# Altium footprint library R 6 DSX 04.PcbLib: 27 footprints (part 2 of 2)
Each footprint in its own frame and in the unit in brackets; x right, y up, seen from the top. Pads: shape width x height; smd on the part's side, far side on the other; paste and mask are expansions set on the pad; w line width, h text height; cw(c..) or ccw(c..) is an arc to the next point about the centre after c.
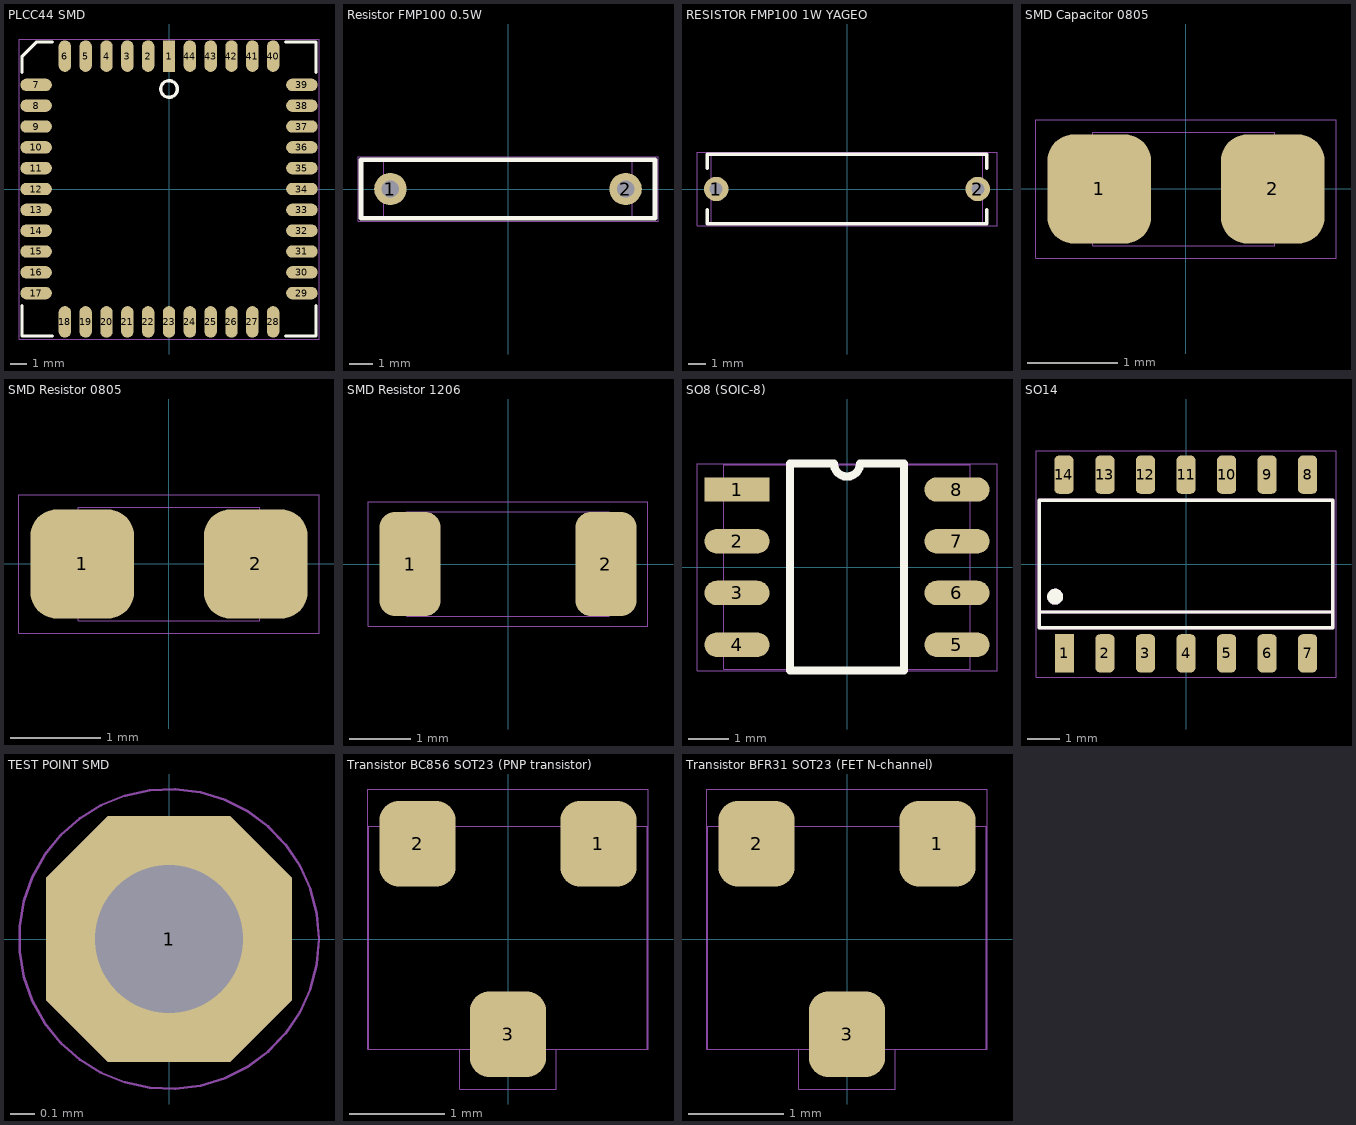
[diagram p1: the footprints below, top view; thin cyan lines are the x and y axes]

## PLCC44 SMD [mm]
height 6.86
pads (44):
  rect 0.76x1.92 smd: 1(0,8.1)
  oval 0.76x1.92 smd: 2(-1.27,8.1) 3(-2.54,8.1) 4(-3.81,8.1) 5(-5.08,8.1) 6(-6.35,8.1) 18(-6.35,-8.1) 19(-5.08,-8.1) 20(-3.81,-8.1) 21(-2.54,-8.1) 22(-1.27,-8.1) 23(0,-8.1) 24(1.27,-8.1) 25(2.54,-8.1) 26(3.81,-8.1) 27(5.08,-8.1) 28(6.35,-8.1) 40(6.35,8.1) 41(5.08,8.1) 42(3.81,8.1) 43(2.54,8.1) 44(1.27,8.1)
  oval 1.92x0.76 smd: 7(-8.1,6.35) 8(-8.1,5.08) 9(-8.1,3.81) 10(-8.1,2.54) 11(-8.1,1.27) 12(-8.1,0) 13(-8.1,-1.27) 14(-8.1,-2.54) 15(-8.1,-3.81) 16(-8.1,-5.08) 17(-8.1,-6.35) 29(8.1,-6.35) 30(8.1,-5.08) 31(8.1,-3.81) 32(8.1,-2.54) 33(8.1,-1.27) 34(8.1,0) 35(8.1,1.27) 36(8.1,2.54) 37(8.1,3.81) 38(8.1,5.08) 39(8.1,6.35)
Top Overlay:
  circle w0.2: c0,6.096 r0.508
  lines w0.2: -8.96,-7.11 -8.96,-8.96 -7.11,-8.96 ; -8.96,7.11 -8.96,8.1 -8.1,8.96 -7.11,8.96 ; 7.11,-8.96 8.96,-8.96 8.96,-7.11 ; 7.11,8.96 8.96,8.96 8.96,7.11
Mechanical 3:
  lines w0.01: -9.144,-9.144 9.144,-9.144 9.144,9.144 -9.144,9.144 -9.144,-9.144
Mechanical 12:
  text ".Designator" at -6.096,-1.524 h4
3D body "MT9092.STEP": height 4.57, standoff 0, extent -8.765,-8.765 8.765,8.765

## Resistor FMP100 0.5W [mm] "Film Resistor FMP100 1W horisontal 10.16 mm by Yageo"
pads (2):
  round 1.4 / inner round 0 / far side round 1.4 hole 0.75: 1(-5.08,0) 2(5.08,0)
Top Overlay:
  lines w0.2: -6.35,-1.27 6.35,-1.27 6.35,1.27 -6.35,1.27 -6.35,-1.27
Mechanical 3:
  lines w0.01: -6.477,-1.397 6.477,-1.397 6.477,1.397 -6.477,1.397 -6.477,-1.397
Mechanical 7:
  lines w0.01: -5.355,-1.2 5.355,-1.2 5.355,1.2 -5.355,1.2 -5.355,-1.2
Mechanical 12:
  text ".Designator" at -1.905,-0.508 h1
3D body "FMP100 1W Hor.STEP": height 4.2, standoff -3, extent -5.355,-1.2 5.355,1.2

## RESISTOR FMP100 1W YAGEO [mm] "Film Resistor FMP100 1W horisontal 10.16 mm by Yageo"
pads (2):
  round 1.4 / inner round 0 / far side round 1.6 hole 0.75: 1(-7.5,0) 2(7.5,0)
Top Overlay:
  lines w0.2: -8,-1.2 -8,-2 8,-2 8,-1.2 ; -8,1.2 -8,2 8,2 8,1.2
Mechanical 3:
  lines w0.01: -8.6,-2.1 -8.6,2.1 8.6,2.1 8.6,-2.1 -8.6,-2.1
Mechanical 7:
  lines w0.01: -7.775,-2 7.775,-2 7.775,2 -7.775,2 -7.775,-2
Mechanical 12:
  text ".Designator" at -1.905,-0.508 h1
3D body "1W SLIM.STEP": height 4.5, standoff -2.5, extent -7.775,-2 7.775,2

## SMD Capacitor 0805 [mm] "Without marking on surface"
height 6.86
pads (2):
  rrect50% 1.14x1.2 smd: 1(-0.955,0) 2(0.955,0)
Mechanical 3:
  lines w0.01: -1.651,-0.762 1.651,-0.762 1.651,0.762 -1.651,0.762 -1.651,-0.762
Mechanical 7:
  lines w0.01: -1.024,-0.625 0.974,-0.625 0.974,0.625 -1.024,0.625 -1.024,-0.625
Mechanical 12:
  text ".Designator" at 0.451,0.435 h4
3D body "0805-2.stp": height 0.8, standoff 0, extent -1.025,-0.625 0.975,0.625

## SMD Resistor 0805 [mm] "Without marking on surface"
height 6.86
pads (2):
  rrect50% 1.14x1.2 smd: 1(-0.955,0) 2(0.955,0)
Mechanical 3:
  lines w0.01: -1.651,-0.762 1.651,-0.762 1.651,0.762 -1.651,0.762 -1.651,-0.762
Mechanical 7:
  lines w0.01: -1,-0.625 1,-0.625 1,0.625 -1,0.625 -1,-0.625
Mechanical 12:
  text ".Designator" at 7.564,1.524 h4
3D body "0805.step": height 0.6, standoff 0, extent -1,-0.625 1,0.625

## SMD Resistor 1206 [mm]
height 6.86
pads (2):
  rrect50% 1x1.7 smd: 1(-1.6,0) 2(1.6,0)
Mechanical 3:
  lines w0.01: -2.286,-1.016 -2.286,1.016 2.286,1.016 2.286,-1.016 -2.286,-1.016
Mechanical 7:
  lines w0.01: -1.65,-0.85 -1.65,0.85 1.65,0.85 1.65,-0.85 -1.65,-0.85
Mechanical 12:
  text ".Designator" at -2.877,-1.84 h4
3D body "RESC-1206.stp": height 0.65, standoff 0, extent -1.65,-0.85 1.65,0.85

## SO8 (SOIC-8) [mm]
height 6.86
pads (8):
  rect 1.6x0.6 smd: 1(-2.7,1.905)
  oval 1.6x0.6 smd: 2(-2.7,0.635) 3(-2.7,-0.635) 4(-2.7,-1.905) 5(2.7,-1.905) 6(2.7,-0.635) 7(2.7,0.635) 8(2.7,1.905)
Top Overlay:
  lines w0.2: -1.397,-2.54 1.397,-2.54 1.397,2.54 0.318,2.54 cw(c0,2.54) -0.318,2.54 -1.397,2.54 -1.397,-2.54
Mechanical 3:
  lines w0.01: -3.683,-2.54 -3.683,2.54 3.683,2.54 3.683,-2.54 -3.683,-2.54
Mechanical 7:
  lines w0.01: -3.021,-2.51 -3.021,2.51 3.021,2.51 3.021,-2.51 -3.021,-2.51
Mechanical 12:
  text ".Designator" at 0.175,-2.429 h4
3D body "sop-8.step": height 1.6, standoff 0, extent -3.021,-2.51 3.021,2.51

## SO14 [mm] "SOIC; 14 Leads; Body Width 3.8 mm; Pitch 1.27 mm"
height 1.8
pads (14):
  rect 0.6x1.2 smd: 1(-3.81,-2.8)
  rrect50% 0.6x1.2 smd: 2(-2.54,-2.8) 3(-1.27,-2.8) 4(0,-2.8) 5(1.27,-2.8) 6(2.54,-2.8) 7(3.81,-2.8) 8(3.81,2.8) 9(2.54,2.8) 10(1.27,2.8) 11(0,2.8) 12(-1.27,2.8) 13(-2.54,2.8) 14(-3.825,2.8)
Top Overlay:
  circle w0.25: c-4.1,-1.025 r0.125
  lines w0.1: -4.6,-1.5 4.6,-1.5 ; -4.6,-2 4.6,-2 4.6,2 -4.6,2 -4.6,-2
Mechanical 3:
  lines w0.01: -4.699,-3.55 4.699,-3.55 4.699,3.55 -4.699,3.55 -4.699,-3.55
Mechanical 12:
  circle w0.25: c-4.1,-1.025 r0.125
  lines w0.1: -4.6,-1.5 4.6,-1.5 ; -4.6,-2 4.6,-2 4.6,2 -4.6,2 -4.6,-2
  text ".Designator" at -2.175,-0.175 h4
3D body "User Library-so14-1.step": height 1.7, standoff 0, extent -4.4,-3 4.4,3

## TEST POINT SMD [mm]
pads (1):
  oct 1x1 / inner round 0 / far side oct 1x1 hole 0.6: 1(0,0)
Mechanical 3:
  circle w0.01: c0,0 r0.61
Mechanical 12:
  text ".Designator" at -0.202,0.476 h2

## Transistor BC856 SOT23 (PNP transistor) [mm] "Transistor BC856 PNP Transistor"
height 6.86
pads (3):
  rrect50% 0.8x0.9 smd: 1(0.95,1) 2(-0.95,1) 3(0,-1)
Mechanical 3:
  lines w0.01: -1.473,-1.159 -0.508,-1.159 -0.508,-1.575 0.508,-1.575 0.508,-1.159 1.473,-1.159 1.473,1.575 -1.473,1.575 -1.473,-1.159
Mechanical 7:
  lines w0.01: -1.46,-1.158 -1.46,1.182 1.46,1.182 1.46,-1.158 -1.46,-1.158
Mechanical 12:
  text ".Designator" at -6.223,1.27 h4
3D body "sot23-1.step": height 1, standoff 0, extent -1.46,-1.158 1.46,1.182

## Transistor BFR31 SOT23 (FET N-channel) [mm] "Transistor BFR31 SOT23 (FET N-channel)"
height 6.86
pads (3):
  rrect50% 0.8x0.9 smd: 1(0.95,1) 2(-0.95,1) 3(0,-1)
Mechanical 3:
  lines w0.01: -1.473,-1.159 -1.473,1.575 1.473,1.575 1.473,-1.159 0.508,-1.159 0.508,-1.575 -0.508,-1.575 -0.508,-1.159 -1.473,-1.159
Mechanical 7:
  lines w0.01: -1.46,-1.158 1.46,-1.158 1.46,1.182 -1.46,1.182 -1.46,-1.158
Mechanical 12:
  text ".Designator" at -5.969,1.016 h4
3D body "sot23-1.step": height 1, standoff 0, extent -1.46,-1.158 1.46,1.182